# Altium footprint library Conectores GAM.PcbLib: 182 footprints (part 10 of 12)
Each footprint in its own frame and in the unit in brackets; x right, y up, seen from the top. Pads: shape width x height; smd on the part's side, far side on the other; paste and mask are expansions set on the pad; w line width, h text height; cw(c..) or ccw(c..) is an arc to the next point about the centre after c.
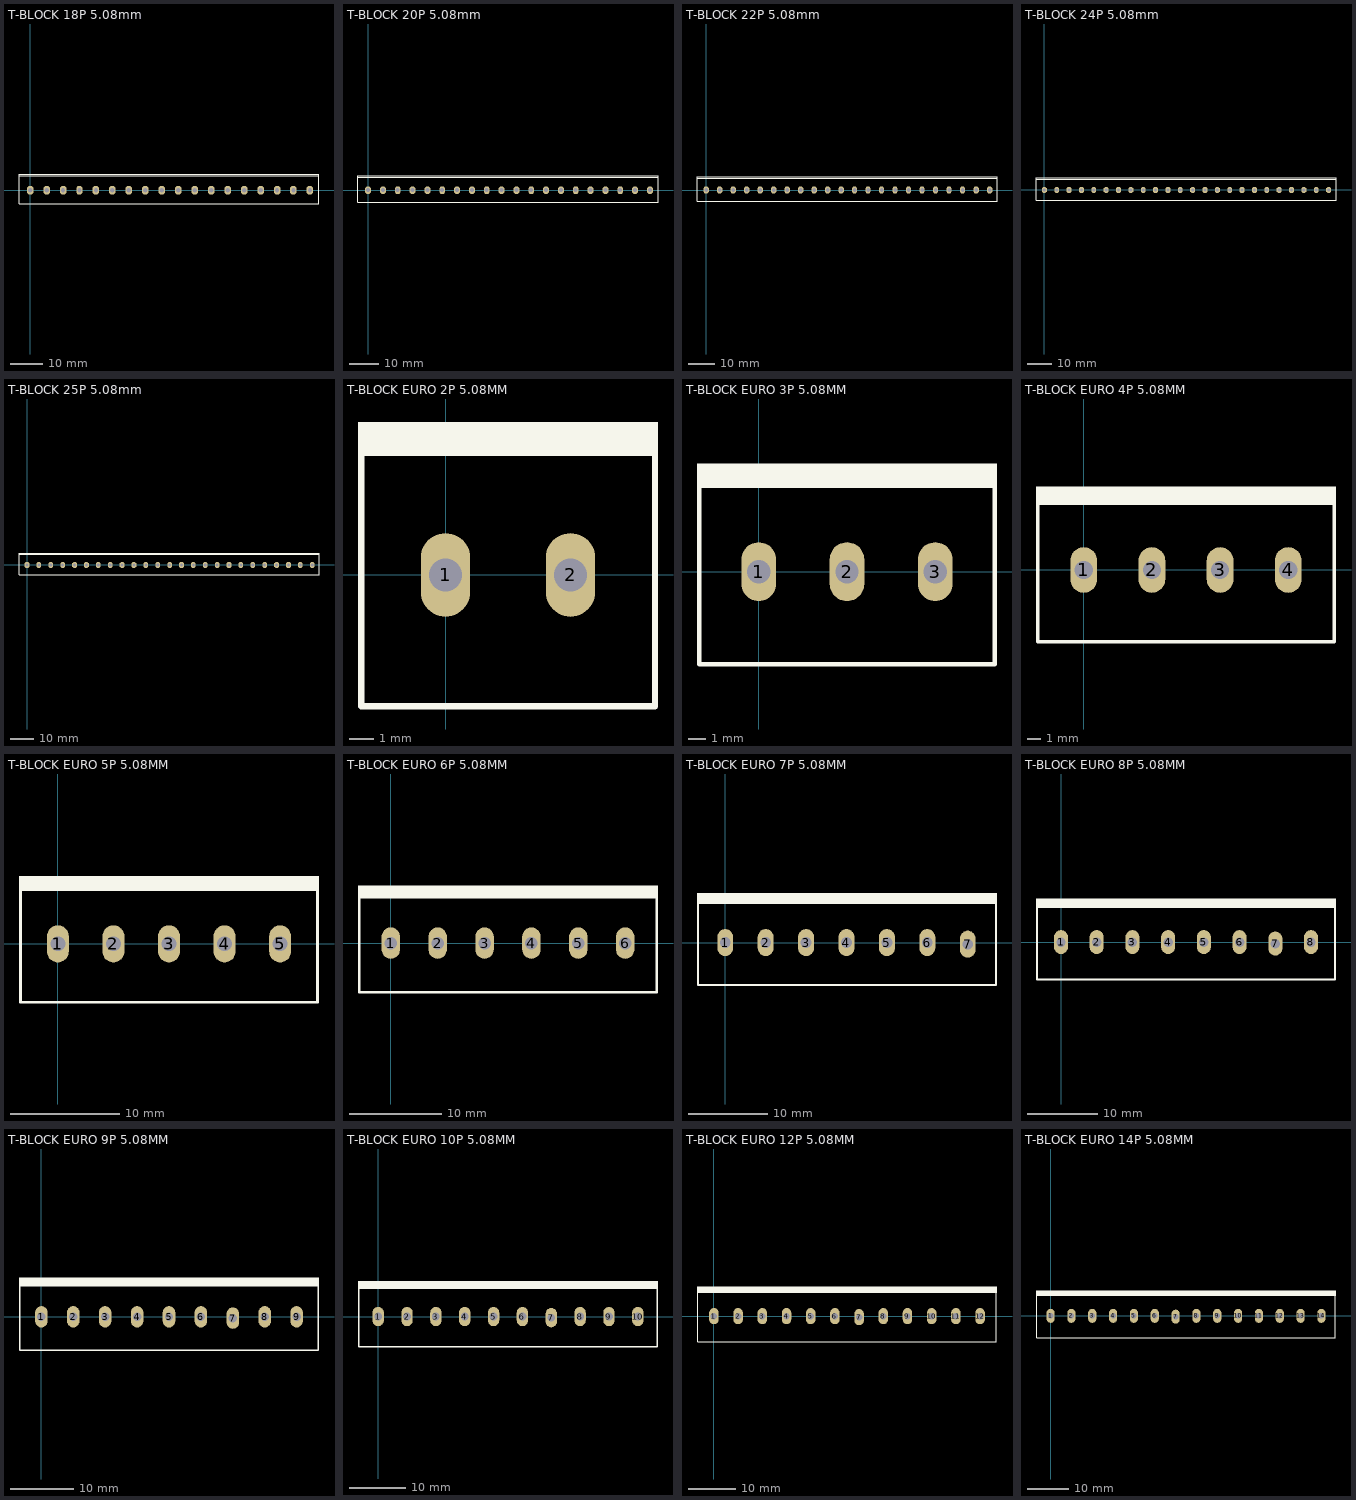
[diagram p9: the footprints below, top view; thin cyan lines are the x and y axes]

## T-BLOCK 18P 5.08mm [mm] "Terminal de Bloque 18P 5.08mm"
pads (18):
  oct 2x2.5 hole 1.35: 1(0,0) 2(5.08,0) 3(10.16,0) 4(15.24,0) 5(20.32,0) 6(25.4,0) 7(30.48,0) 8(35.56,0) 9(40.64,0) 10(45.72,0) 11(50.8,0) 12(55.88,0) 13(60.96,0) 14(66.04,0) 15(71.12,0) 16(76.2,0) 17(81.28,0) 18(86.36,0)
Top Overlay:
  lines w0.254: -3.302,4.445 89.154,4.445 ; -3.429,-4.191 -3.429,4.953 89.154,4.953 89.154,-4.191 -3.429,-4.191
3D body "tb1p.step": height 12.5, standoff -4.4, extent 83.22,-3.992 88.9,5.008
3D body "tb1p.step": height 12.5, standoff -4.4, extent 78.14,-3.992 83.82,5.008
3D body "tb1p.step": height 12.5, standoff -4.4, extent 62.9,-3.992 68.58,5.008
3D body "tb1p.step": height 12.5, standoff -4.4, extent 57.82,-3.992 63.5,5.008
3D body "tb1p.step": height 12.5, standoff -4.4, extent -3.14,-3.992 2.54,5.008
3D body "tb1p.step": height 12.5, standoff -4.4, extent 1.94,-3.992 7.62,5.008
3D body "tb1p.step": height 12.5, standoff -4.4, extent 7.02,-3.992 12.7,5.008
3D body "tb1p.step": height 12.5, standoff -4.4, extent 22.26,-3.992 27.94,5.008
3D body "tb1p.step": height 12.5, standoff -4.4, extent 17.18,-3.992 22.86,5.008
3D body "tb1p.step": height 12.5, standoff -4.4, extent 12.1,-3.992 17.78,5.008
3D body "tb1p.step": height 12.5, standoff -4.4, extent 27.34,-3.992 33.02,5.008
3D body "tb1p.step": height 12.5, standoff -4.4, extent 32.42,-3.992 38.1,5.008
3D body "tb1p.step": height 12.5, standoff -4.4, extent 42.58,-3.992 48.26,5.008
3D body "tb1p.step": height 12.5, standoff -4.4, extent 37.5,-3.992 43.18,5.008
3D body "tb1p.step": height 12.5, standoff -4.4, extent 47.66,-3.992 53.34,5.008
3D body "tb1p.step": height 12.5, standoff -4.4, extent 52.74,-3.992 58.42,5.008
3D body "tb1p.step": height 12.5, standoff -4.4, extent 67.98,-3.992 73.66,5.008
3D body "tb1p.step": height 12.5, standoff -4.4, extent 73.06,-3.992 78.74,5.008

## T-BLOCK 20P 5.08mm [mm] "Terminal de Bloque 20P 5.08mm"
pads (20):
  oct 2x2.5 hole 1.35: 1(0,0) 2(5.08,0) 3(10.16,0) 4(15.24,0) 5(20.32,0) 6(25.4,0) 7(30.48,0) 8(35.56,0) 9(40.64,0) 10(45.72,0) 11(50.8,0) 12(55.88,0) 13(60.96,0) 14(66.04,0) 15(71.12,0) 16(76.2,0) 17(81.28,0) 18(86.36,0) 19(91.44,0) 20(96.52,0)
Top Overlay:
  lines w0.254: -3.302,4.445 99.314,4.445 ; -3.429,-4.191 99.314,-4.191 99.314,4.953 -3.429,4.953 -3.429,-4.191
3D body "tb1p.step": height 12.5, standoff -4.4, extent 93.323,-3.992 99.003,5.008
3D body "tb1p.step": height 12.5, standoff -4.4, extent 88.244,-3.992 93.923,5.008
3D body "tb1p.step": height 12.5, standoff -4.4, extent 73.06,-3.992 78.74,5.008
3D body "tb1p.step": height 12.5, standoff -4.4, extent 67.98,-3.992 73.66,5.008
3D body "tb1p.step": height 12.5, standoff -4.4, extent 52.74,-3.992 58.42,5.008
3D body "tb1p.step": height 12.5, standoff -4.4, extent 47.66,-3.992 53.34,5.008
3D body "tb1p.step": height 12.5, standoff -4.4, extent 37.5,-3.992 43.18,5.008
3D body "tb1p.step": height 12.5, standoff -4.4, extent 42.58,-3.992 48.26,5.008
3D body "tb1p.step": height 12.5, standoff -4.4, extent 32.42,-3.992 38.1,5.008
3D body "tb1p.step": height 12.5, standoff -4.4, extent 27.34,-3.992 33.02,5.008
3D body "tb1p.step": height 12.5, standoff -4.4, extent 12.1,-3.992 17.78,5.008
3D body "tb1p.step": height 12.5, standoff -4.4, extent 17.18,-3.992 22.86,5.008
3D body "tb1p.step": height 12.5, standoff -4.4, extent 22.26,-3.992 27.94,5.008
3D body "tb1p.step": height 12.5, standoff -4.4, extent 7.02,-3.992 12.7,5.008
3D body "tb1p.step": height 12.5, standoff -4.4, extent 1.94,-3.992 7.62,5.008
3D body "tb1p.step": height 12.5, standoff -4.4, extent -3.14,-3.992 2.54,5.008
3D body "tb1p.step": height 12.5, standoff -4.4, extent 57.82,-3.992 63.5,5.008
3D body "tb1p.step": height 12.5, standoff -4.4, extent 62.9,-3.992 68.58,5.008
3D body "tb1p.step": height 12.5, standoff -4.4, extent 78.14,-3.992 83.82,5.008
3D body "tb1p.step": height 12.5, standoff -4.4, extent 83.22,-3.992 88.9,5.008

## T-BLOCK 22P 5.08mm [mm] "Terminal de Bloque 22P 5.08mm"
pads (22):
  oct 2x2.5 hole 1.35: 1(0,0) 2(5.08,0) 3(10.16,0) 4(15.24,0) 5(20.32,0) 6(25.4,0) 7(30.48,0) 8(35.56,0) 9(40.64,0) 10(45.72,0) 11(50.8,0) 12(55.88,0) 13(60.96,0) 14(66.04,0) 15(71.12,0) 16(76.2,0) 17(81.28,0) 18(86.36,0) 19(91.44,0) 20(96.52,0) 21(101.61,0) 22(106.69,0)
Top Overlay:
  lines w0.254: -3.302,4.445 109.474,4.445 ; -3.429,-4.191 109.474,-4.191 109.474,4.953 -3.429,4.953 -3.429,-4.191
3D body "tb1p.step": height 12.5, standoff -4.4, extent 103.493,-3.992 109.173,5.008
3D body "tb1p.step": height 12.5, standoff -4.4, extent 98.413,-3.992 104.093,5.008
3D body "tb1p.step": height 12.5, standoff -4.4, extent 93.323,-3.992 99.003,5.008
3D body "tb1p.step": height 12.5, standoff -4.4, extent 88.244,-3.992 93.923,5.008
3D body "tb1p.step": height 12.5, standoff -4.4, extent 73.06,-3.992 78.74,5.008
3D body "tb1p.step": height 12.5, standoff -4.4, extent 67.98,-3.992 73.66,5.008
3D body "tb1p.step": height 12.5, standoff -4.4, extent 52.74,-3.992 58.42,5.008
3D body "tb1p.step": height 12.5, standoff -4.4, extent 47.66,-3.992 53.34,5.008
3D body "tb1p.step": height 12.5, standoff -4.4, extent 37.5,-3.992 43.18,5.008
3D body "tb1p.step": height 12.5, standoff -4.4, extent 42.58,-3.992 48.26,5.008
3D body "tb1p.step": height 12.5, standoff -4.4, extent 32.42,-3.992 38.1,5.008
3D body "tb1p.step": height 12.5, standoff -4.4, extent 27.34,-3.992 33.02,5.008
3D body "tb1p.step": height 12.5, standoff -4.4, extent 12.1,-3.992 17.78,5.008
3D body "tb1p.step": height 12.5, standoff -4.4, extent 17.18,-3.992 22.86,5.008
3D body "tb1p.step": height 12.5, standoff -4.4, extent 22.26,-3.992 27.94,5.008
3D body "tb1p.step": height 12.5, standoff -4.4, extent 7.02,-3.992 12.7,5.008
3D body "tb1p.step": height 12.5, standoff -4.4, extent 1.94,-3.992 7.62,5.008
3D body "tb1p.step": height 12.5, standoff -4.4, extent -3.14,-3.992 2.54,5.008
3D body "tb1p.step": height 12.5, standoff -4.4, extent 57.82,-3.992 63.5,5.008
3D body "tb1p.step": height 12.5, standoff -4.4, extent 62.9,-3.992 68.58,5.008
3D body "tb1p.step": height 12.5, standoff -4.4, extent 78.14,-3.992 83.82,5.008
3D body "tb1p.step": height 12.5, standoff -4.4, extent 83.22,-3.992 88.9,5.008

## T-BLOCK 24P 5.08mm [mm] "Terminal de Bloque 24P 5.08mm"
pads (24):
  oct 2x2.5 hole 1.35: 1(0,0) 2(5.08,0) 3(10.16,0) 4(15.24,0) 5(20.32,0) 6(25.4,0) 7(30.48,0) 8(35.56,0) 9(40.64,0) 10(45.72,0) 11(50.8,0) 12(55.88,0) 13(60.96,0) 14(66.04,0) 15(71.12,0) 16(76.2,0) 17(81.28,0) 18(86.36,0) 19(91.44,0) 20(96.52,0) 21(101.61,0) 22(106.69,0) 23(111.789,0) 24(116.869,0)
Top Overlay:
  lines w0.254: -3.302,4.445 119.888,4.445 ; -3.429,-4.191 -3.429,4.953 119.888,4.953 119.888,-4.191 -3.429,-4.191
3D body "tb1p.step": height 12.5, standoff -4.4, extent 83.22,-3.992 88.9,5.008
3D body "tb1p.step": height 12.5, standoff -4.4, extent 78.14,-3.992 83.82,5.008
3D body "tb1p.step": height 12.5, standoff -4.4, extent 62.9,-3.992 68.58,5.008
3D body "tb1p.step": height 12.5, standoff -4.4, extent 57.82,-3.992 63.5,5.008
3D body "tb1p.step": height 12.5, standoff -4.4, extent -3.14,-3.992 2.54,5.008
3D body "tb1p.step": height 12.5, standoff -4.4, extent 1.94,-3.992 7.62,5.008
3D body "tb1p.step": height 12.5, standoff -4.4, extent 7.02,-3.992 12.7,5.008
3D body "tb1p.step": height 12.5, standoff -4.4, extent 22.26,-3.992 27.94,5.008
3D body "tb1p.step": height 12.5, standoff -4.4, extent 17.18,-3.992 22.86,5.008
3D body "tb1p.step": height 12.5, standoff -4.4, extent 12.1,-3.992 17.78,5.008
3D body "tb1p.step": height 12.5, standoff -4.4, extent 27.34,-3.992 33.02,5.008
3D body "tb1p.step": height 12.5, standoff -4.4, extent 32.42,-3.992 38.1,5.008
3D body "tb1p.step": height 12.5, standoff -4.4, extent 42.58,-3.992 48.26,5.008
3D body "tb1p.step": height 12.5, standoff -4.4, extent 37.5,-3.992 43.18,5.008
3D body "tb1p.step": height 12.5, standoff -4.4, extent 47.66,-3.992 53.34,5.008
3D body "tb1p.step": height 12.5, standoff -4.4, extent 52.74,-3.992 58.42,5.008
3D body "tb1p.step": height 12.5, standoff -4.4, extent 67.98,-3.992 73.66,5.008
3D body "tb1p.step": height 12.5, standoff -4.4, extent 73.06,-3.992 78.74,5.008
3D body "tb1p.step": height 12.5, standoff -4.4, extent 88.244,-3.992 93.923,5.008
3D body "tb1p.step": height 12.5, standoff -4.4, extent 93.323,-3.992 99.003,5.008
3D body "tb1p.step": height 12.5, standoff -4.4, extent 98.413,-3.992 104.093,5.008
3D body "tb1p.step": height 12.5, standoff -4.4, extent 103.493,-3.992 109.173,5.008
3D body "tb1p.step": height 12.5, standoff -4.4, extent 108.593,-3.992 114.273,5.008
3D body "tb1p.step": height 12.5, standoff -4.4, extent 113.673,-3.992 119.353,5.008

## T-BLOCK 25P 5.08mm [mm] "Terminal de Bloque 25P 5.08mm"
pads (25):
  oct 2x2.5 hole 1.35: 1(0,0) 2(5.08,0) 3(10.16,0) 4(15.24,0) 5(20.32,0) 6(25.4,0) 7(30.48,0) 8(35.56,0) 9(40.64,0) 10(45.72,0) 11(50.8,0) 12(55.88,0) 13(60.96,0) 14(66.04,0) 15(71.12,0) 16(76.2,0) 17(81.28,0) 18(86.36,0) 19(91.44,0) 20(96.52,0) 21(101.61,0) 22(106.69,0) 23(111.789,0) 24(116.869,0) 25(121.929,-0.003)
Top Overlay:
  lines w0.254: -3.302,4.445 124.841,4.445 ; -3.429,-4.191 -3.429,4.953 124.841,4.953 124.841,-4.191 -3.429,-4.191
3D body "tb1p.step": height 12.5, standoff -4.4, extent 118.732,-3.995 124.412,5.005
3D body "tb1p.step": height 12.5, standoff -4.4, extent 83.22,-3.992 88.9,5.008
3D body "tb1p.step": height 12.5, standoff -4.4, extent 78.14,-3.992 83.82,5.008
3D body "tb1p.step": height 12.5, standoff -4.4, extent 62.9,-3.992 68.58,5.008
3D body "tb1p.step": height 12.5, standoff -4.4, extent 57.82,-3.992 63.5,5.008
3D body "tb1p.step": height 12.5, standoff -4.4, extent -3.14,-3.992 2.54,5.008
3D body "tb1p.step": height 12.5, standoff -4.4, extent 1.94,-3.992 7.62,5.008
3D body "tb1p.step": height 12.5, standoff -4.4, extent 7.02,-3.992 12.7,5.008
3D body "tb1p.step": height 12.5, standoff -4.4, extent 22.26,-3.992 27.94,5.008
3D body "tb1p.step": height 12.5, standoff -4.4, extent 17.18,-3.992 22.86,5.008
3D body "tb1p.step": height 12.5, standoff -4.4, extent 12.1,-3.992 17.78,5.008
3D body "tb1p.step": height 12.5, standoff -4.4, extent 27.34,-3.992 33.02,5.008
3D body "tb1p.step": height 12.5, standoff -4.4, extent 32.42,-3.992 38.1,5.008
3D body "tb1p.step": height 12.5, standoff -4.4, extent 42.58,-3.992 48.26,5.008
3D body "tb1p.step": height 12.5, standoff -4.4, extent 37.5,-3.992 43.18,5.008
3D body "tb1p.step": height 12.5, standoff -4.4, extent 47.66,-3.992 53.34,5.008
3D body "tb1p.step": height 12.5, standoff -4.4, extent 52.74,-3.992 58.42,5.008
3D body "tb1p.step": height 12.5, standoff -4.4, extent 67.98,-3.992 73.66,5.008
3D body "tb1p.step": height 12.5, standoff -4.4, extent 73.06,-3.992 78.74,5.008
3D body "tb1p.step": height 12.5, standoff -4.4, extent 88.244,-3.992 93.923,5.008
3D body "tb1p.step": height 12.5, standoff -4.4, extent 93.323,-3.992 99.003,5.008
3D body "tb1p.step": height 12.5, standoff -4.4, extent 98.413,-3.992 104.093,5.008
3D body "tb1p.step": height 12.5, standoff -4.4, extent 103.493,-3.992 109.173,5.008
3D body "tb1p.step": height 12.5, standoff -4.4, extent 108.593,-3.992 114.273,5.008
3D body "tb1p.step": height 12.5, standoff -4.4, extent 113.673,-3.992 119.353,5.008

## T-BLOCK EURO 2P 5.08MM [mm] "Terminal de Bloque 2P 5.08mm EURO STYLE"
pads (2):
  oval 2x3.4 hole 1.35: 1(0,0) 2(5.08,0)
Top Overlay:
  rectangle: -3.556,4.826 8.636,6.223
  lines w0.254: -3.429,-5.334 8.509,-5.334 8.509,6.096 -3.429,6.096 -3.429,-5.334
3D body "CUI_DEVICES_TB009-508-02BE.step": height 20, standoff -3.5, extent -3.14,-5.293 8.22,5.207

## T-BLOCK EURO 3P 5.08MM [mm] "Terminal de Bloque 3P 5.08mm EURO STYLE"
pads (3):
  oval 2x3.4 hole 1.35: 1(0,0) 2(5.08,0) 3(10.16,0)
Top Overlay:
  rectangle: -3.556,4.826 13.716,6.223
  lines w0.254: -3.429,-5.334 -3.429,6.096 13.589,6.096 13.589,-5.334 -3.429,-5.334
3D body "CUI_DEVICES_TB009-508-03BE.step": height 20, standoff -3.5, extent -3.14,-4.912 13.3,5.588

## T-BLOCK EURO 4P 5.08MM [mm] "Terminal de Bloque 4P 5.08mm EURO STYLE"
pads (4):
  oval 2x3.4 hole 1.35: 1(0,0) 2(5.08,0) 3(10.16,0) 4(15.24,0)
Top Overlay:
  rectangle: -3.556,4.826 18.796,6.223
  lines w0.254: -3.429,-5.334 -3.429,6.096 18.669,6.096 18.669,-5.334 -3.429,-5.334
3D body "CUI_DEVICES_TB009-508-04BE.step": height 20, standoff -3.5, extent -3.14,-4.826 18.38,5.674

## T-BLOCK EURO 5P 5.08MM [mm] "Terminal de Bloque 5P 5.08mm EURO STYLE"
pads (5):
  oval 2x3.4 hole 1.35: 1(0,0) 2(5.08,0) 3(10.16,0) 4(15.24,0) 5(20.32,0)
Top Overlay:
  rectangle: -3.556,4.826 23.876,6.223
  lines w0.254: -3.429,-5.334 -3.429,6.096 23.749,6.096 23.749,-5.334 -3.429,-5.334
3D body "CUI_DEVICES_TB009-508-05BE.step": height 20, standoff -3.5, extent -3.175,-4.953 23.425,5.547

## T-BLOCK EURO 6P 5.08MM [mm] "Terminal de Bloque 6P 5.08mm EURO STYLE"
pads (6):
  oval 2x3.4 hole 1.35: 1(0,0) 2(5.08,0) 3(10.16,0) 4(15.24,0) 5(20.32,0) 6(25.4,0)
Top Overlay:
  rectangle: -3.556,4.826 28.956,6.223
  lines w0.254: -3.429,-5.334 -3.429,6.096 28.829,6.096 28.829,-5.334 -3.429,-5.334
3D body "CUI_DEVICES_TB009-508-06BE.step": height 20, standoff -3.5, extent -3.14,-4.953 28.54,5.547

## T-BLOCK EURO 7P 5.08MM [mm] "Terminal de Bloque 7P 5.08mm EURO STYLE"
pads (7):
  oval 2x3.4 hole 1.35: 1(0,0) 2(5.08,0) 3(10.16,0) 4(15.24,0) 5(20.32,0) 6(25.4,0) 7(30.48,-0.208)
Top Overlay:
  rectangle: -3.556,4.826 34.163,6.223
  lines w0.254: -3.429,-5.334 -3.429,6.096 34.036,6.096 34.036,-5.334 -3.429,-5.334
3D body "CUI_DEVICES_TB009-508-07BE.step": height 20, standoff -3.5, extent -3.105,-4.953 33.655,5.547

## T-BLOCK EURO 8P 5.08MM [mm] "Terminal de Bloque 8P 5.08mm EURO STYLE"
pads (8):
  oval 2x3.4 hole 1.35: 1(0,0) 2(5.08,0) 3(10.16,0) 4(15.24,0) 5(20.32,0) 6(25.4,0) 7(30.48,-0.208) 8(35.56,0)
Top Overlay:
  rectangle: -3.556,4.826 39.116,6.223
  lines w0.254: -3.429,-5.334 38.989,-5.334 38.989,6.096 -3.429,6.096 -3.429,-5.334
3D body "CUI_DEVICES_TB009-508-08BE.step": height 20, standoff -3.5, extent -3.175,-4.953 38.665,5.547

## T-BLOCK EURO 9P 5.08MM [mm] "Terminal de Bloque 9P 5.08mm EURO STYLE"
pads (9):
  oval 2x3.4 hole 1.35: 1(0,0) 2(5.08,0) 3(10.16,0) 4(15.24,0) 5(20.32,0) 6(25.4,0) 7(30.48,-0.208) 8(35.56,0) 9(40.64,0)
Top Overlay:
  rectangle: -3.556,4.826 44.196,6.223
  lines w0.254: -3.429,-5.334 44.069,-5.334 44.069,6.096 -3.429,6.096 -3.429,-5.334
3D body "CUI_DEVICES_TB009-508-09BE.step": height 20, standoff -3.5, extent -3.175,-4.953 43.745,5.547

## T-BLOCK EURO 10P 5.08MM [mm] "Terminal de Bloque 10P 5.08mm EURO STYLE"
pads (10):
  oval 2x3.4 hole 1.35: 1(0,0) 2(5.08,0) 3(10.16,0) 4(15.24,0) 5(20.32,0) 6(25.4,0) 7(30.48,-0.208) 8(35.56,0) 9(40.64,0) 10(45.72,0)
Top Overlay:
  rectangle: -3.556,4.826 49.276,6.223
  lines w0.254: -3.429,-5.334 49.149,-5.334 49.149,6.096 -3.429,6.096 -3.429,-5.334
3D body "CUI_DEVICES_TB009-508-10BE.step": height 20, standoff -3.5, extent -3.14,-4.953 48.86,5.547

## T-BLOCK EURO 12P 5.08MM [mm] "Terminal de Bloque 12P 5.08mm EURO STYLE"
pads (12):
  oval 2x3.4 hole 1.35: 1(0,0) 2(5.08,0) 3(10.16,0) 4(15.24,0) 5(20.32,0) 6(25.4,0) 7(30.48,-0.208) 8(35.56,0) 9(40.64,0) 10(45.72,0) 11(50.8,0) 12(55.88,0)
Top Overlay:
  rectangle: -3.556,4.826 59.436,6.223
  lines w0.254: -3.429,-5.334 59.309,-5.334 59.309,6.096 -3.429,6.096 -3.429,-5.334
3D body "CUI_DEVICES_TB009-508-12BE.step": height 20, standoff -3.5, extent -3.175,-4.953 58.985,5.547

## T-BLOCK EURO 14P 5.08MM [mm] "Terminal de Bloque 14P 5.08mm EURO STYLE"
pads (14):
  oval 2x3.4 hole 1.35: 1(0,0) 2(5.08,0) 3(10.16,0) 4(15.24,0) 5(20.32,0) 6(25.4,0) 7(30.48,-0.208) 8(35.56,0) 9(40.64,0) 10(45.72,0) 11(50.8,0) 12(55.88,0) 13(60.96,0) 14(66.04,0)
Top Overlay:
  rectangle: -3.556,4.826 69.596,6.223
  lines w0.254: -3.429,-5.334 69.469,-5.334 69.469,6.096 -3.429,6.096 -3.429,-5.334
3D body "CUI_DEVICES_TB009-508-14BE.step": height 20, standoff -3.5, extent -3.175,-4.953 69.145,5.547